# Altium footprint library GSM.PcbLib: 12 footprints
Each footprint in its own frame and in the unit in brackets; x right, y up, seen from the top. Pads: shape width x height; smd on the part's side, far side on the other; paste and mask are expansions set on the pad; w line width, h text height; cw(c..) or ccw(c..) is an arc to the next point about the centre after c.
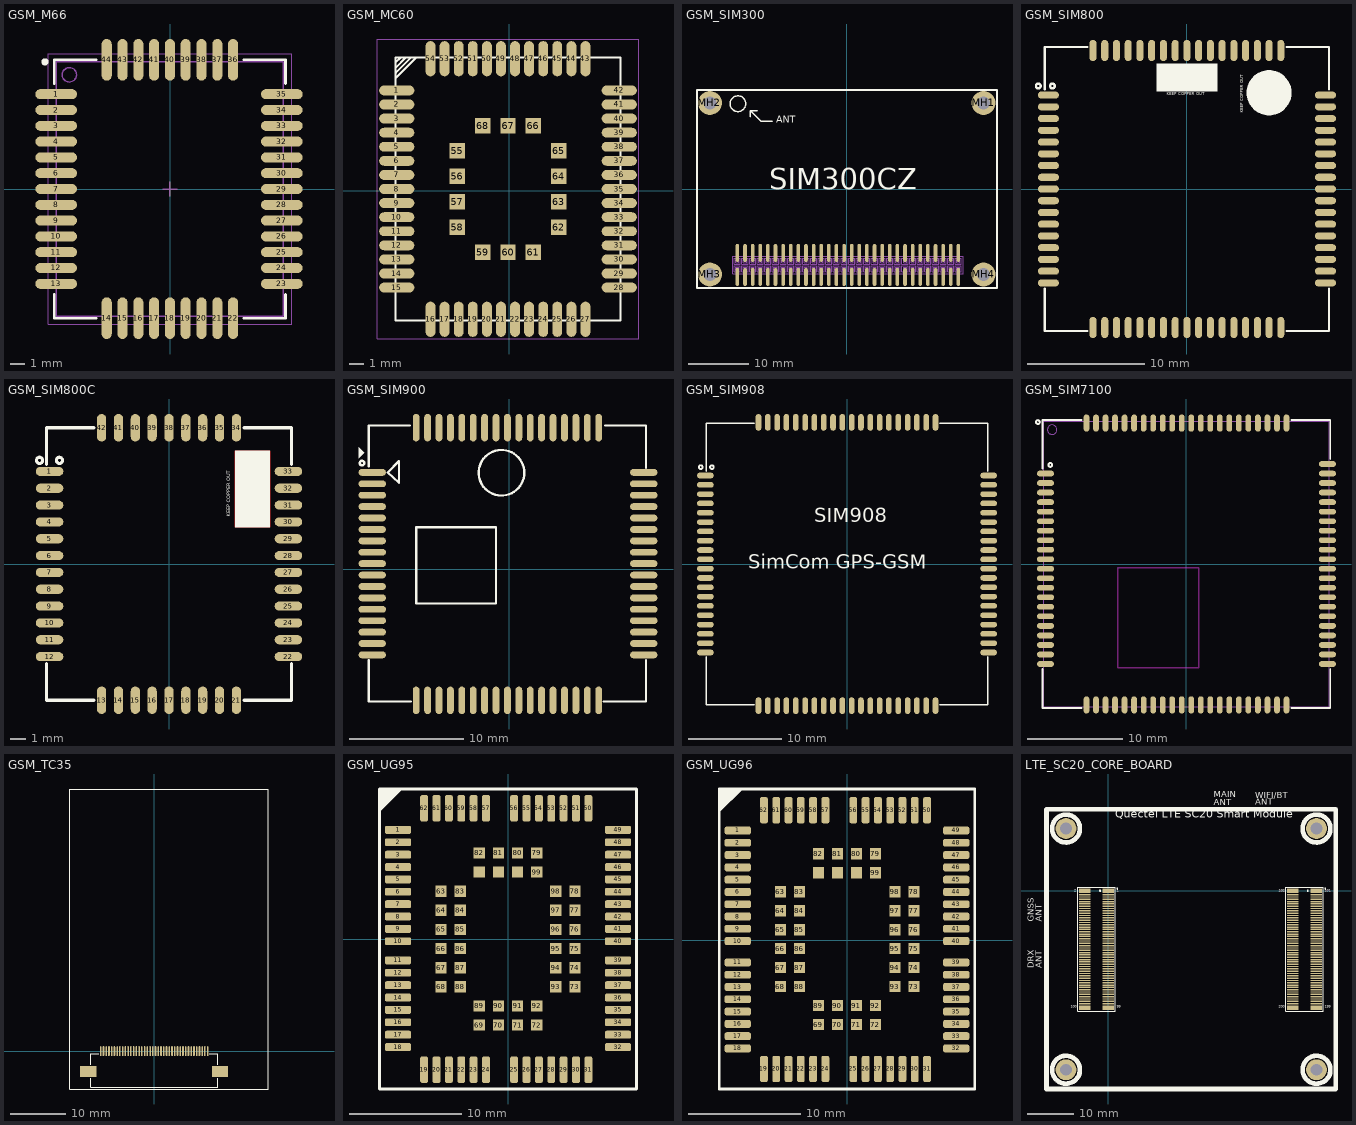
[diagram p0: the footprints below, top view; thin cyan lines are the x and y axes]

## GSM_M66 [mm]
pads (44):
  oval 2.9x0.7 smd: 1(-7.94,6.6) 2(-7.94,5.5) 3(-7.94,4.4) 4(-7.94,3.3) 5(-7.94,2.2) 6(-7.94,1.1) 7(-7.94,0) 8(-7.94,-1.1) 9(-7.94,-2.2) 10(-7.94,-3.3) 11(-7.94,-4.4) 12(-7.94,-5.5) 13(-7.94,-6.6) 23(7.769,-6.6) 24(7.769,-5.5) 25(7.769,-4.4) 26(7.769,-3.3) 27(7.769,-2.2) 28(7.769,-1.1) 29(7.769,0) 30(7.769,1.1) 31(7.769,2.2) 32(7.769,3.3) 33(7.769,4.4) 34(7.769,5.5) 35(7.769,6.6)
  oval 0.7x2.9 smd: 14(-4.422,-8.995) 15(-3.322,-8.995) 16(-2.222,-8.995) 17(-1.122,-8.995) 18(-0.022,-8.995) 19(1.078,-8.995) 20(2.178,-8.995) 21(3.278,-8.995) 22(4.378,-8.995) 36(4.378,8.995) 37(3.278,8.995) 38(2.178,8.995) 39(1.078,8.995) 40(-0.022,8.995) 41(-1.122,8.995) 42(-2.222,8.995) 43(-3.322,8.995) 44(-4.422,8.995)
Top Overlay:
  circle w0.25: c-8.722,8.85 r0.125
  lines w0.2: -8.072,-7.35 -8.072,-9 -5.172,-9 ; -8.072,7.35 -8.072,9 -5.172,9 ; 5.128,-9 8.028,-9 8.028,-7.35 ; 5.128,9 8.028,9 8.028,7.35
Mechanical 13:
  circle w0.1: c-7.022,7.95 r0.5
  lines w0.1: -7.922,-8.85 7.878,-8.85 7.878,8.85 -7.922,8.85 -7.922,-8.85
Mechanical 15:
  lines w0.05: -8.497,-9.425 8.453,-9.425 8.453,9.425 -8.497,9.425 -8.497,-9.425
  lines w0.1: -0.522,0 0.478,0 ; -0.022,-0.5 -0.022,0.5
3D body "User Library-m66_3d_150917_asm.STEP": height 2.3, standoff 0, extent -7.922,-8.85 7.878,8.85

## GSM_MC60 [mm]
pads (68):
  oval 2.5x0.7 smd: 1(-8,7.127) 2(-8,6.127) 3(-8,5.127) 4(-8,4.127) 5(-8,3.127) 6(-8,2.127) 7(-8,1.127) 8(-8,0.127) 9(-8,-0.873) 10(-8,-1.873) 11(-8,-2.873) 12(-8,-3.873) 13(-8,-4.873) 14(-8,-5.873) 15(-8,-6.873) 28(7.8,-6.873) 29(7.8,-5.873) 30(7.8,-4.873) 31(7.8,-3.873) 32(7.8,-2.873) 33(7.8,-1.873) 34(7.8,-0.873) 35(7.8,0.127) 36(7.8,1.127) 37(7.8,2.127) 38(7.8,3.127) 39(7.8,4.127) 40(7.8,5.127) 41(7.8,6.127) 42(7.8,7.127)
  oval 0.7x2.5 smd: 16(-5.6,-9.123) 17(-4.6,-9.123) 18(-3.6,-9.123) 19(-2.6,-9.123) 20(-1.6,-9.123) 21(-0.6,-9.123) 22(0.4,-9.123) 23(1.4,-9.123) 24(2.4,-9.123) 25(3.4,-9.123) 26(4.4,-9.123) 27(5.4,-9.123) 43(5.4,9.377) 44(4.4,9.377) 45(3.4,9.377) 46(2.4,9.377) 47(1.4,9.377) 48(0.4,9.377) 49(-0.6,9.377) 50(-1.6,9.377) 51(-2.6,9.377) 52(-3.6,9.377) 53(-4.6,9.377) 54(-5.6,9.377)
  rect 1.1x1.1 smd: 55(-3.7,2.827) 56(-3.7,1.027) 57(-3.7,-0.773) 58(-3.7,-2.573) 59(-1.9,-4.373) 60(-0.1,-4.373) 61(1.7,-4.373) 62(3.5,-2.573) 63(3.5,-0.773) 64(3.5,1.027) 65(3.5,2.827) 66(1.7,4.627) 67(-0.1,4.627) 68(-1.9,4.627)
Top Overlay:
  lines w0.01: -8.1,9.377 -8,9.477
  lines w0.15: -8.1,8.71 -7.34,9.47 ; -8.1,9.08 -7.715,9.465 ; -8.09,8 -6.625,9.465 ; -8.07,8.38 -6.975,9.475 ; -8.1,-9.223 7.9,-9.223 7.9,9.477 -8.1,9.477 -8.1,-9.223
Mechanical 1:
  lines w0.01: -9.4,-10.523 -9.4,10.777 9.2,10.777 9.2,-10.523 -9.4,-10.523
3D body "User Library-Quectel MC60.STEP": height 2.1, standoff 0, extent -8.1,-9.203 7.903,9.5

## GSM_SIM300 [mm]
height 1.092
pads (64):
  oval 0.6x3 smd: 1(-18.224,-14.6) 2(-18.224,-10.6) 3(-16.954,-14.6) 4(-16.954,-10.6) 5(-15.684,-14.6) 6(-15.684,-10.6) 7(-14.414,-14.6) 8(-14.414,-10.6) 9(-13.144,-14.6) 10(-13.144,-10.6) 11(-11.874,-14.6) 12(-11.874,-10.6) 13(-10.604,-14.6) 14(-10.604,-10.6) 15(-9.335,-14.6) 16(-9.335,-10.6) 17(-8.064,-14.6) 18(-8.064,-10.6) 19(-6.794,-14.6) 20(-6.794,-10.6) 21(-5.524,-14.6) 22(-5.524,-10.6) 23(-4.255,-14.6) 24(-4.255,-10.6) 25(-2.984,-14.6) 26(-2.984,-10.6) 27(-1.714,-14.6) 28(-1.714,-10.6) 29(-0.445,-14.6) 30(-0.445,-10.6) 31(0.826,-14.6) 32(0.826,-10.6) 33(2.095,-14.6) 34(2.095,-10.6) 35(3.365,-14.6) 36(3.365,-10.6) 37(4.635,-14.6) 38(4.635,-10.6) 39(5.905,-14.6) 40(5.905,-10.6) 41(7.175,-14.6) 42(7.175,-10.6) 43(8.445,-14.6) 44(8.445,-10.6) 45(9.716,-14.6) 46(9.716,-10.6) 47(10.986,-14.6) 48(10.986,-10.6) 49(12.255,-14.6) 50(12.255,-10.6) 51(13.525,-14.6) 52(13.525,-10.6) 53(14.795,-14.6) 54(14.795,-10.6) 55(16.066,-14.6) 56(16.066,-10.6) 57(17.335,-14.6) 58(17.335,-10.6) 59(18.605,-14.6) 60(18.605,-10.6)
  round 4 hole 2.2: MH1(22.796,14.395) MH2(-22.796,14.395) MH3(-22.796,-14.18) MH4(22.796,-14.18)
Top Overlay:
  circle w0.254: c-18.135,14.268 r1.308
  lines w0.254: -16.066,12.109 -16.066,13.125 ; -14.922,13.125 -16.066,13.125 ; -12.383,11.347 -14.287,11.347 -16.066,13.125 ; -24.956,-16.446 25.045,-16.446 25.045,16.554 -24.956,16.554 -24.956,-16.446
  text "SIM300CZ" at -12.89,0.044 h3.56
  text "ANT" at -11.747,11.093 h1.14
Mechanical 1:
  drawing of 484 lines, arcs and shapes, not listed
  text "60" at 19.748,-9.862 h0.76
  text "59" at 19.748,-14.434 h0.76
  text "1" at -20.002,-15.45 h0.76
  text "2" at -20.002,-9.862 h0.76
3D body "User Library-SIM300C.step": height 8.79, standoff -3.05, extent -25.971,-16.488 26.51,16.635

## GSM_SIM800 [mm]
pads (68):
  oval 1.8x0.6 smd: 1(-11.8,8) 2(-11.8,7) 3(-11.8,6) 4(-11.8,5) 5(-11.8,4) 6(-11.8,3) 7(-11.8,2) 8(-11.8,1) 9(-11.8,0) 10(-11.8,-1) 11(-11.8,-2) 12(-11.8,-3) 13(-11.8,-4) 14(-11.8,-5) 15(-11.8,-6) 16(-11.8,-7) 17(-11.8,-8) 35(11.8,-8) 36(11.8,-7) 37(11.8,-6) 38(11.8,-5) 39(11.8,-4) 40(11.8,-3) 41(11.8,-2) 42(11.8,-1) 43(11.8,0) 44(11.8,1) 45(11.8,2) 46(11.8,3) 47(11.8,4) 48(11.8,5) 49(11.8,6) 50(11.8,7) 51(11.8,8)
  oval 0.6x1.8 smd: 18(-8,-11.8) 19(-7,-11.8) 20(-6,-11.8) 21(-5,-11.8) 22(-4,-11.8) 23(-3,-11.8) 24(-2,-11.8) 25(-1,-11.8) 26(0,-11.8) 27(1,-11.8) 28(2,-11.8) 29(3,-11.8) 30(4,-11.8) 31(5,-11.8) 32(6,-11.8) 33(7,-11.8) 34(8,-11.8) 52(8,11.8) 53(7,11.8) 54(6,11.8) 55(5,11.8) 56(4,11.8) 57(3,11.8) 58(2,11.8) 59(1,11.8) 60(0,11.8) 61(-1,11.8) 62(-2,11.8) 63(-3,11.8) 64(-4,11.8) 65(-5,11.8) 66(-6,11.8) 67(-7,11.8) 68(-8,11.8)
Top Overlay:
  circle w0.2: c-12.655,8.774 r0.2
  circle w0.2: c-11.455,8.774 r0.2
  rectangle: -2.6,8.3 2.6,10.7
  region: 5.1,8.2 5.1,8.387 5.173,8.754 5.316,9.1 5.524,9.411 5.789,9.676 6.1,9.884 6.446,10.027 6.813,10.1 7,10.1 7.187,10.1 7.554,10.027 7.9,9.884 8.211,9.676 8.476,9.411 8.684,9.1 8.827,8.754 8.9,8.387 8.9,8.2 8.9,8.013 8.827,7.646 8.684,7.3 8.476,6.989 8.211,6.724 7.9,6.516 7.554,6.373 7.187,6.3 7,6.3 6.813,6.3 6.446,6.373 6.1,6.516 5.789,6.724 5.524,6.989 5.316,7.3 5.173,7.646 5.1,8.013
  lines w0.2: -12.1,-8.5 -12.1,-12.1 -8.5,-12.1 ; -12.1,8.5 -12.1,12.1 -8.5,12.1 ; 8.5,-12.1 12.1,-12.1 12.1,-8.5 ; 8.5,12.1 12.1,12.1 12.1,8.5
  text "KEEP COPPER OUT" at -1.7,7.9 h0.4
  text "KEEP COPPER OUT" at 4.9,6.5 h0.4
3D body "User Library-SIM800.step": height 3.1, standoff 0.1, extent -12,-12 12,12

## GSM_SIM800C [mm] "GSM, SIM800C, 42-L, 15.7X17.6mm"
pads (42):
  oval 1.8x0.6 smd: 1(-7.8,6.05) 2(-7.8,4.95) 3(-7.8,3.85) 4(-7.8,2.75) 5(-7.8,1.65) 6(-7.8,0.55) 7(-7.8,-0.55) 8(-7.8,-1.65) 9(-7.8,-2.75) 10(-7.8,-3.85) 11(-7.8,-4.95) 12(-7.8,-6.05) 22(7.8,-6.05) 23(7.8,-4.95) 24(7.8,-3.85) 25(7.8,-2.75) 26(7.8,-1.65) 27(7.8,-0.55) 28(7.8,0.55) 29(7.8,1.65) 30(7.8,2.75) 31(7.8,3.85) 32(7.8,4.95) 33(7.8,6.05)
  oval 0.6x1.8 smd: 13(-4.4,-8.9) 14(-3.3,-8.9) 15(-2.2,-8.9) 16(-1.1,-8.9) 17(0,-8.9) 18(1.1,-8.9) 19(2.2,-8.9) 20(3.3,-8.9) 21(4.4,-8.9) 34(4.4,8.9) 35(3.3,8.9) 36(2.2,8.9) 37(1.1,8.9) 38(0,8.9) 39(-1.1,8.9) 40(-2.2,8.9) 41(-3.3,8.9) 42(-4.4,8.9)
Top Layer:
  pour cut-out: 6.6,7.4 4.3,7.4 4.3,2.4 6.6,2.4
Top Overlay:
  circle w0.2: c-8.455,6.774 r0.2
  circle w0.2: c-7.155,6.774 r0.2
  rectangle: 4.3,2.4 6.6,7.4
  lines w0.2: -8,-6.5 -8,-8.9 -4.9,-8.9 ; -8,6.5 -8,8.9 -4.9,8.9 ; 4.9,-8.9 8,-8.9 8,-6.5 ; 4.9,8.9 8,8.9 8,6.5
  text "KEEP COPPER OUT" at 4.1,3.1 h0.4
3D body "SIM800C-1.STEP": height 2.37, standoff 0.03, extent -7.849,-8.812 7.851,8.788

## GSM_SIM900 [mm] "SIM900_SIM900A"
pads (68):
  oval 2.4x0.6 smd mask+0.1: 1(-12,8.48) 2(-12,7.48) 3(-12,6.48) 4(-12,5.48) 5(-12,4.48) 6(-12,3.48) 7(-12,2.48) 8(-12,1.48) 9(-12,0.48) 10(-12,-0.52) 11(-12,-1.52) 12(-12,-2.52) 13(-12,-3.52) 14(-12,-4.52) 15(-12,-5.52) 16(-12,-6.52) 17(-12,-7.52) 35(11.8,-7.52) 36(11.8,-6.52) 37(11.8,-5.52) 38(11.8,-4.52) 39(11.8,-3.52) 40(11.8,-2.52) 41(11.8,-1.52) 42(11.8,-0.52) 43(11.8,0.48) 44(11.8,1.48) 45(11.8,2.48) 46(11.8,3.48) 47(11.8,4.48) 48(11.8,5.48) 49(11.8,6.48) 50(11.8,7.48) 51(11.8,8.48)
  oval 0.6x2.4 smd mask+0.1: 18(-8.15,-11.5) 19(-7.15,-11.5) 20(-6.15,-11.5) 21(-5.15,-11.5) 22(-4.15,-11.5) 23(-3.15,-11.5) 24(-2.15,-11.5) 25(-1.15,-11.5) 26(-0.15,-11.5) 27(0.85,-11.5) 28(1.85,-11.5) 29(2.85,-11.5) 30(3.85,-11.5) 31(4.85,-11.5) 32(5.85,-11.5) 33(6.85,-11.5) 34(7.85,-11.5) 52(7.85,12.4) 53(6.85,12.4) 54(5.85,12.4) 55(4.85,12.4) 56(3.85,12.4) 57(2.85,12.4) 58(1.85,12.4) 59(0.85,12.4) 60(-0.15,12.4) 61(-1.15,12.4) 62(-2.15,12.4) 63(-3.15,12.4) 64(-4.15,12.4) 65(-5.15,12.4) 66(-6.15,12.4) 67(-7.15,12.4) 68(-8.15,12.4)
Top Overlay:
  circle w0.2: c-0.67,8.45 r2
  circle w0.2: c-12.9,9.3 r0.2
  region: -13.2,9.7 -13.2,10.7 -12.7,10.2
  lines w0.2: -12.3,-8 -12.3,-11.6 -8.6,-11.6 ; -12.3,9 -12.3,12.6 -8.7,12.6 ; 8.3,-11.6 12,-11.6 12,-8 ; 8.4,12.6 12,12.6 12,8.9 ; -10.65,8.48 -9.65,7.58 -9.65,9.48 -10.65,8.48 ; -8.15,-3.02 -8.15,3.68 -1.15,3.68 -1.15,-3.02 -8.15,-3.02
3D body "GSM_SIM900.STEP": height 3, standoff 0, extent -12.15,-11.5 11.85,12.5

## GSM_SIM908 [mm] "SimCom Sim908 GPS/GSM"
pads (80):
  oval 1.8x0.6 smd: 1(-15.2,9.5) 2(-15.2,8.5) 3(-15.2,7.5) 4(-15.2,6.5) 5(-15.2,5.5) 6(-15.2,4.5) 7(-15.2,3.5) 8(-15.2,2.5) 9(-15.2,1.5) 10(-15.2,0.5) 11(-15.2,-0.5) 12(-15.2,-1.5) 13(-15.2,-2.5) 14(-15.2,-3.5) 15(-15.2,-4.5) 16(-15.2,-5.5) 17(-15.2,-6.5) 18(-15.2,-7.5) 19(-15.2,-8.5) 20(-15.2,-9.5) 41(15.2,-9.5) 42(15.2,-8.5) 43(15.2,-7.5) 44(15.2,-6.5) 45(15.2,-5.5) 46(15.2,-4.5) 47(15.2,-3.5) 48(15.2,-2.5) 49(15.2,-1.5) 50(15.2,-0.5) 51(15.2,0.5) 52(15.2,1.5) 53(15.2,2.5) 54(15.2,3.5) 55(15.2,4.5) 56(15.2,5.5) 57(15.2,6.5) 58(15.2,7.5) 59(15.2,8.5) 60(15.2,9.5)
  oval 0.6x1.8 smd: 21(-9.5,-15.2) 22(-8.5,-15.2) 23(-7.5,-15.2) 24(-6.5,-15.2) 25(-5.5,-15.2) 26(-4.5,-15.2) 27(-3.5,-15.2) 28(-2.5,-15.2) 29(-1.5,-15.2) 30(-0.5,-15.2) 31(0.5,-15.2) 32(1.5,-15.2) 33(2.5,-15.2) 34(3.5,-15.2) 35(4.5,-15.2) 36(5.5,-15.2) 37(6.5,-15.2) 38(7.5,-15.2) 39(8.5,-15.2) 40(9.5,-15.2) 61(9.5,15.2) 62(8.5,15.2) 63(7.5,15.2) 64(6.5,15.2) 65(5.5,15.2) 66(4.5,15.2) 67(3.5,15.2) 68(2.5,15.2) 69(1.5,15.2) 70(0.5,15.2) 71(-0.5,15.2) 72(-1.5,15.2) 73(-2.5,15.2) 74(-3.5,15.2) 75(-4.5,15.2) 76(-5.5,15.2) 77(-6.5,15.2) 78(-7.5,15.2) 79(-8.5,15.2) 80(-9.5,15.2)
Top Overlay:
  circle w0.2: c-14.5,10.4 r0.2
  circle w0.2: c-15.7,10.4 r0.2
  lines w0.2: -15.1,-10 -15.1,-15.1 -10,-15.1 ; -15.1,10 -15.1,15.1 -10,15.1 ; 10,-15.1 15.1,-15.1 15.1,-10 ; 10,15.1 15.1,15.1 15.1,10
  text "SimCom GPS-GSM" at -10.576,-0.5 h1.52
  text "SIM908" at -3.5,4.5 h1.52
3D body "User Library-SIM908.STEP": height 3.39, standoff 0.19, extent -15,-15 15,15

## GSM_SIM7100 [mm] "SIM7100 SIM5360 87-lead pitch:1mm 30x30mm"
height 2.9
pads (87):
  oval 1.8x0.6 smd mask+0.075: 1(-14.8,9.5) 2(-14.8,8.5) 3(-14.8,7.5) 4(-14.8,6.5) 5(-14.8,5.5) 6(-14.8,4.5) 7(-14.8,3.5) 8(-14.8,2.5) 9(-14.8,1.5) 10(-14.8,0.5) 11(-14.8,-0.5) 12(-14.8,-1.5) 13(-14.8,-2.5) 14(-14.8,-3.5) 15(-14.8,-4.5) 16(-14.8,-5.5) 17(-14.8,-6.5) 18(-14.8,-7.5) 19(-14.8,-8.5) 20(-14.8,-9.5) 41(14.8,-9.5) 42(14.8,-8.5) 43(14.8,-7.5) 44(14.8,-6.5) 45(14.8,-5.5) 46(14.8,-4.5) 47(14.8,-3.5) 48(14.8,-2.5) 49(14.8,-1.5) 50(14.8,-0.5) 51(14.8,0.5) 52(14.8,1.5) 53(14.8,2.5) 54(14.8,3.5) 55(14.8,4.5) 56(14.8,5.5) 57(14.8,6.5) 58(14.8,7.5) 59(14.8,8.5) 60(14.8,9.5) 81(-14.8,-10.5) 82(14.8,-10.5) 85(14.8,10.5)
  oval 0.6x1.8 smd mask+0.075: 21(-9.5,-14.8) 22(-8.5,-14.8) 23(-7.5,-14.8) 24(-6.5,-14.8) 25(-5.5,-14.8) 26(-4.5,-14.8) 27(-3.5,-14.8) 28(-2.5,-14.8) 29(-1.5,-14.8) 30(-0.5,-14.8) 31(0.5,-14.8) 32(1.5,-14.8) 33(2.5,-14.8) 34(3.5,-14.8) 35(4.5,-14.8) 36(5.5,-14.8) 37(6.5,-14.8) 38(7.5,-14.8) 39(8.5,-14.8) 40(9.5,-14.8) 61(9.5,14.8) 62(8.5,14.8) 63(7.5,14.8) 64(6.5,14.8) 65(5.5,14.8) 66(4.5,14.8) 67(3.5,14.8) 68(2.5,14.8) 69(1.5,14.8) 70(0.5,14.8) 71(-0.5,14.8) 72(-1.5,14.8) 73(-2.5,14.8) 74(-3.5,14.8) 75(-4.5,14.8) 76(-5.5,14.8) 77(-6.5,14.8) 78(-7.5,14.8) 79(-8.5,14.8) 80(-9.5,14.8) 83(10.5,-14.8) 84(-10.5,-14.8) 86(-10.5,14.8) 87(10.5,14.8)
Top Overlay:
  circle w0.2: c-14.3,10.4 r0.2
  circle w0.2: c-15.6,14.9 r0.2
  lines w0.2: -15.1,-11 -15.1,-15.1 -11,-15.1 ; -15.1,10 -15.1,15.1 -11,15.1 ; 11,-15.1 15.1,-15.1 15.1,-11 ; 11,15.1 15.1,15.1 15.1,11
Keep-Out Layer:
  lines w0.15: -7.2,-10.9 -7.2,-0.4 1.3,-0.4 1.3,-10.9 -7.2,-10.9
Mechanical 13:
  circle w0.1: c-14.1,14.1 r0.5
  lines w0.1: -15,-15 -15,15 15,15 15,-15 -15,-15
3D body "User Library-SIM7100C.step": height 3.17, standoff 0, extent -15,-15 15,15

## GSM_TC35 [mm]
pads (42):
  oval 0.3x1.8 smd mask+0.05: 1(9.75,0) 2(9.25,0) 3(8.75,0) 4(8.25,0) 5(7.75,0) 6(7.25,0) 7(6.75,0) 8(6.25,0) 9(5.75,0) 10(5.25,0) 11(4.75,0) 12(4.25,0) 13(3.75,0) 14(3.25,0) 15(2.75,0) 16(2.25,0) 17(1.75,0) 18(1.25,0) 19(0.75,0) 20(0.25,0) 21(-0.25,0) 22(-0.75,0) 23(-1.25,0) 24(-1.75,0) 25(-2.25,0) 26(-2.75,0) 27(-3.25,0) 28(-3.75,0) 29(-4.25,0) 30(-4.75,0) 31(-5.25,0) 32(-5.75,0) 33(-6.25,0) 34(-6.75,0) 35(-7.25,0) 36(-7.75,0) 37(-8.25,0) 38(-8.75,0) 39(-9.25,0) 40(-9.75,0)
  rrect0% 3x2 smd: ""(-12,-3.7) ""(12,-3.7)
Top Overlay:
  lines w0.2: -11.6,-4.9 -11.6,-6.6 11.55,-6.6 ; -11.6,-2.5 -11.6,-0.5 -10.074,-0.5 ; 10.074,-0.5 11.6,-0.5 11.6,-2.5 ; 11.6,-6.6 11.6,-4.9 ; -15.4,-6.9 20.8,-6.9 20.8,47.8 -15.4,47.8 -15.4,-6.9
3D body: height 3, standoff 0.1, extent -11.5,-6.6 11.55,-0.6
3D body "User Library-siemens tc35i module.STEP": height 5.55, standoff 2, extent -15.264,-6.772 20.736,47.728

## GSM_UG95 [mm]
pads (102):
  rrect50% 2.35x0.7 smd: 1(-9.779,9.696) 2(-9.779,8.595) 3(-9.779,7.495) 4(-9.779,6.395) 5(-9.779,5.295) 6(-9.779,4.196) 7(-9.779,3.096) 8(-9.779,1.996) 9(-9.779,0.895) 10(-9.779,-0.205) 11(-9.779,-1.904) 12(-9.779,-3.004) 13(-9.779,-4.105) 14(-9.779,-5.205) 15(-9.779,-6.305) 16(-9.779,-7.404) 17(-9.779,-8.504) 18(-9.779,-9.604) 32(9.779,-9.604) 33(9.779,-8.504) 34(9.779,-7.404) 35(9.779,-6.305) 36(9.779,-5.205) 37(9.779,-4.105) 38(9.779,-3.004) 39(9.779,-1.904) 40(9.779,-0.205) 41(9.779,0.895) 42(9.779,1.996) 43(9.779,3.096) 44(9.779,4.196) 45(9.779,5.295) 46(9.779,6.395) 47(9.779,7.495) 48(9.779,8.595) 49(9.779,9.696)
  rrect50% 0.7x2.35 smd: 19(-7.454,-11.62) 20(-6.354,-11.62) 21(-5.254,-11.62) 22(-4.154,-11.62) 23(-3.054,-11.62) 24(-1.954,-11.62) 25(0.546,-11.62) 26(1.646,-11.62) 27(2.746,-11.62) 28(3.846,-11.62) 29(4.946,-11.62) 30(6.046,-11.62) 31(7.146,-11.62) 50(7.146,11.62) 51(6.046,11.62) 52(4.946,11.62) 53(3.846,11.62) 54(2.746,11.62) 55(1.646,11.62) 56(0.546,11.62) 57(-1.954,11.62) 58(-3.054,11.62) 59(-4.154,11.62) 60(-5.254,11.62) 61(-6.354,11.62) 62(-7.454,11.62)
  rect 1x1 smd: 63(-5.954,4.246) 64(-5.954,2.546) 65(-5.954,0.846) 66(-5.954,-0.845) 67(-5.954,-2.546) 68(-5.954,-4.246) 69(-2.554,-7.645) 70(-0.854,-7.645) 71(0.846,-7.645) 72(2.546,-7.645) 73(5.945,-4.254) 74(5.945,-2.554) 75(5.945,-0.854) 76(5.945,0.846) 77(5.945,2.546) 78(5.945,4.246) 79(2.546,7.655) 80(0.846,7.655) 81(-0.854,7.654) 82(-2.554,7.655) 83(-4.255,4.246) 84(-4.255,2.546) 85(-4.255,0.846) 86(-4.255,-0.854) 87(-4.255,-2.554) 88(-4.255,-4.254) 89(-2.554,-5.945) 90(-0.854,-5.945) 91(0.846,-5.945) 92(2.546,-5.945) 93(4.246,-4.246) 94(4.246,-2.546) 95(4.246,-0.845) 96(4.246,0.846) 97(4.246,2.546) 98(4.246,4.246) 99(2.546,5.954) 100(0.846,5.955) 101(-0.854,5.954) 102(-2.554,5.955)
Top Overlay:
  region: -11.43,11.43 -11.43,13.335 -9.525,13.335
  lines w0.254: -11.43,11.43 -9.525,13.335 ; -11.43,-13.335 -11.43,13.335 11.43,13.335 11.43,-13.335 -11.43,-13.335
3D body: height 2.2, standoff 0.05, extent -9.906,-11.811 10.033,11.811

## GSM_UG96 [mm]
pads (102):
  rrect50% 2.35x0.7 smd: 1(-9.779,9.805) 2(-9.779,8.705) 3(-9.779,7.605) 4(-9.779,6.505) 5(-9.779,5.405) 6(-9.779,4.306) 7(-9.779,3.206) 8(-9.779,2.105) 9(-9.779,1.005) 10(-9.779,-0.095) 11(-9.779,-2.004) 12(-9.779,-3.104) 13(-9.779,-4.205) 14(-9.779,-5.305) 15(-9.779,-6.405) 16(-9.779,-7.504) 17(-9.779,-8.604) 18(-9.779,-9.704) 32(9.779,-9.704) 33(9.779,-8.605) 34(9.779,-7.505) 35(9.779,-6.405) 36(9.779,-5.305) 37(9.779,-4.205) 38(9.779,-3.105) 39(9.779,-2.005) 40(9.779,-0.095) 41(9.779,1.005) 42(9.779,2.105) 43(9.779,3.205) 44(9.779,4.305) 45(9.779,5.405) 46(9.779,6.505) 47(9.779,7.605) 48(9.779,8.705) 49(9.779,9.805)
  rrect50% 0.7x2.35 smd: 19(-7.434,-11.541) 20(-6.334,-11.541) 21(-5.234,-11.541) 22(-4.134,-11.541) 23(-3.034,-11.541) 24(-1.934,-11.541) 25(0.566,-11.541) 26(1.666,-11.541) 27(2.766,-11.541) 28(3.866,-11.541) 29(4.966,-11.541) 30(6.066,-11.541) 31(7.166,-11.541) 50(7.166,11.62) 51(6.066,11.62) 52(4.966,11.62) 53(3.866,11.62) 54(2.766,11.62) 55(1.666,11.62) 56(0.566,11.62) 57(-1.934,11.62) 58(-3.034,11.62) 59(-4.134,11.62) 60(-5.234,11.62) 61(-6.334,11.62) 62(-7.434,11.62)
  rect 1x1 smd: 63(-5.954,4.326) 64(-5.954,2.626) 65(-5.954,0.926) 66(-5.954,-0.765) 67(-5.954,-2.466) 68(-5.954,-4.166) 69(-2.554,-7.565) 70(-0.854,-7.565) 71(0.846,-7.565) 72(2.546,-7.565) 73(5.995,-4.166) 74(5.995,-2.466) 75(5.995,-0.765) 76(5.995,0.926) 77(5.995,2.626) 78(5.995,4.326) 79(2.546,7.725) 80(0.846,7.725) 81(-0.854,7.724) 82(-2.554,7.725) 83(-4.255,4.326) 84(-4.255,2.626) 85(-4.255,0.926) 86(-4.255,-0.765) 87(-4.255,-2.466) 88(-4.255,-4.166) 89(-2.554,-5.866) 90(-0.854,-5.866) 91(0.846,-5.866) 92(2.546,-5.866) 93(4.296,-4.166) 94(4.296,-2.466) 95(4.296,-0.765) 96(4.296,0.926) 97(4.296,2.626) 98(4.296,4.326) 99(2.546,6.024) 100(0.846,6.025) 101(-0.854,6.024) 102(-2.554,6.025)
Top Overlay:
  region: -11.42,11.59 -11.42,13.495 -9.515,13.495
  lines w0.254: -11.43,13.495 -11.43,-13.335 11.43,-13.335 11.43,13.52 -11.43,13.52 ; -11.42,11.59 -9.515,13.495
3D body "User Library-MOD_QUECTEL_UG96.STEP": height 2.2, standoff 0, extent -11.236,-13.15 11.264,13.35

## LTE_SC20_CORE_BOARD [mm]
pads (204):
  rrect20% 2.5x1 smd mask+0.075: 1(0,0) 2(-5.1,0) 99(0,-25.2) 100(-5.1,-25.2) 101(44.85,0) 102(39.77,0) 199(44.85,-25.2) 200(39.77,-25.2)
  rrect20% 2.5x0.3 smd mask+0.075: 3(0,-0.85) 4(-5.08,-0.85) 5(0,-1.35) 6(-5.08,-1.35) 7(0,-1.85) 8(-5.08,-1.85) 9(0,-2.35) 10(-5.08,-2.35) 11(0,-2.85) 12(-5.08,-2.85) 13(0,-3.35) 14(-5.08,-3.35) 15(0,-3.85) 16(-5.08,-3.85) 17(0,-4.35) 18(-5.08,-4.35) 19(0,-4.85) 20(-5.08,-4.85) 21(0,-5.35) 22(-5.08,-5.35) 23(0,-5.85) 24(-5.08,-5.85) 25(0,-6.35) 26(-5.08,-6.35) 27(0,-6.85) 28(-5.08,-6.85) 29(0,-7.35) 30(-5.08,-7.35) 31(0,-7.85) 32(-5.08,-7.85) 33(0,-8.35) 34(-5.08,-8.35) 35(0,-8.85) 36(-5.08,-8.85) 37(0,-9.35) 38(-5.08,-9.35) 39(0,-9.85) 40(-5.08,-9.85) 41(0,-10.35) 42(-5.08,-10.35) 43(0,-10.85) 44(-5.08,-10.85) 45(0,-11.35) 46(-5.08,-11.35) 47(0,-11.85) 48(-5.08,-11.85) 49(0,-12.35) 50(-5.08,-12.35) 51(0,-12.85) 52(-5.08,-12.85) 53(0,-13.35) 54(-5.08,-13.35) 55(0,-13.85) 56(-5.08,-13.85) 57(0,-14.35) 58(-5.08,-14.35) 59(0,-14.85) 60(-5.08,-14.85) 61(0,-15.35) 62(-5.08,-15.35) 63(0,-15.85) 64(-5.08,-15.85) 65(0,-16.35) 66(-5.08,-16.35) 67(0,-16.85) 68(-5.08,-16.85) 69(0,-17.35) 70(-5.08,-17.35) 71(0,-17.85) 72(-5.08,-17.85) 73(0,-18.35) 74(-5.08,-18.35) 75(0,-18.85) 76(-5.08,-18.85) 77(0,-19.35) 78(-5.08,-19.35) 79(0,-19.85) 80(-5.08,-19.85) 81(0,-20.35) 82(-5.08,-20.35) 83(0,-20.85) 84(-5.08,-20.85) 85(0,-21.35) 86(-5.08,-21.35) 87(0,-21.85) 88(-5.08,-21.85) 89(0,-22.35) 90(-5.08,-22.35) 91(0,-22.85) 92(-5.08,-22.85) 93(0,-23.35) 94(-5.08,-23.35) 95(0,-23.85) 96(-5.08,-23.85) 97(0,-24.35) 98(-5.08,-24.35) 103(44.85,-0.85) 104(39.77,-0.85) 105(44.85,-1.35) 106(39.77,-1.35) 107(44.85,-1.85) 108(39.77,-1.85) 109(44.85,-2.35) 110(39.77,-2.35) 111(44.85,-2.85) 112(39.77,-2.85) 113(44.85,-3.35) 114(39.77,-3.35) 115(44.85,-3.85) 116(39.77,-3.85) 117(44.85,-4.35) 118(39.77,-4.35) 119(44.85,-4.85) 120(39.77,-4.85) 121(44.85,-5.35) 122(39.77,-5.35) 123(44.85,-5.85) 124(39.77,-5.85) 125(44.85,-6.35) 126(39.77,-6.35) 127(44.85,-6.85) 128(39.77,-6.85) 129(44.85,-7.35) 130(39.77,-7.35) 131(44.85,-7.85) 132(39.77,-7.85) 133(44.85,-8.35) 134(39.77,-8.35) 135(44.85,-8.85) 136(39.77,-8.85) 137(44.85,-9.35) 138(39.77,-9.35) 139(44.85,-9.85) 140(39.77,-9.85) 141(44.85,-10.35) 142(39.77,-10.35) 143(44.85,-10.85) 144(39.77,-10.85) 145(44.85,-11.35) 146(39.77,-11.35) 147(44.85,-11.85) 148(39.77,-11.85) 149(44.85,-12.35) 150(39.77,-12.35) 151(44.85,-12.85) 152(39.77,-12.85) 153(44.85,-13.35) 154(39.77,-13.35) 155(44.85,-13.85) 156(39.77,-13.85) 157(44.85,-14.35) 158(39.77,-14.35) 159(44.85,-14.85) 160(39.77,-14.85) 161(44.85,-15.35) 162(39.77,-15.35) 163(44.85,-15.85) 164(39.77,-15.85) 165(44.85,-16.35) 166(39.77,-16.35) 167(44.85,-16.85) 168(39.77,-16.85) 169(44.85,-17.35) 170(39.77,-17.35) 171(44.85,-17.85) 172(39.77,-17.85) 173(44.85,-18.35) 174(39.77,-18.35) 175(44.85,-18.85) 176(39.77,-18.85) 177(44.85,-19.35) 178(39.77,-19.35) 179(44.85,-19.85) 180(39.77,-19.85) 181(44.85,-20.35) 182(39.77,-20.35) 183(44.85,-20.85) 184(39.77,-20.85) 185(44.85,-21.35) 186(39.77,-21.35) 187(44.85,-21.85) 188(39.77,-21.85) 189(44.85,-22.35) 190(39.77,-22.35) 191(44.85,-22.85) 192(39.77,-22.85) 193(44.85,-23.35) 194(39.77,-23.35) 195(44.85,-23.85) 196(39.77,-23.85) 197(44.85,-24.35) 198(39.77,-24.35)
  round 4.5 hole 2.5: ""(-9.1,-38.6) ""(-9.1,13.4) ""(44.9,-38.6) ""(44.9,13.4)
Top Overlay:
  circle w0.2: c1.95,0.45 r0.1
  circle w0.2: c-1.75,0 r0.15
  circle w0.2: c43.02,0 r0.15
  circle w0.2: c46.81,0.45 r0.1
  lines w0.2: -6.57,-25.95 1.5,-25.95 1.5,0.75 -6.57,0.75 -6.57,-25.95 ; 38.28,-25.95 38.28,0.75 46.35,0.75 46.35,-25.95 38.28,-25.95
  lines w1: -6.105,-38.434 cw(c-9.1,-38.6) -6.105,-38.429 ; -6.105,13.566 cw(c-9.1,13.4) -6.105,13.571 ; 47.895,-38.434 cw(c44.9,-38.6) 47.895,-38.429 ; 47.895,13.566 cw(c44.9,13.4) 47.895,13.571 ; -13.3,-42.75 49.05,-42.75 49.05,17.55 -13.3,17.55 -13.3,-42.75 ; -13.3,-42.75 -13.3,-42.75 ; -13.3,-42.75 -13.3,-42.75
  text "ANT" at -13.75,-16.7 h2.3
  text "DRX" at -15.522,-16.7 h2.3
  text "100" at -8.1,-25.45 h1
  text "99" at 1.8,-25.45 h1
  text "1" at 1.8,-0.45 h1
  text "2" at -7.283,-0.45 h1
  text "102" at 36.75,-0.45 h1
  text "101" at 46.65,-0.45 h1
  text "199" at 46.65,-25.45 h1
  text "200" at 36.75,-25.45 h1
  text "Quectel LTE SC20 Smart Module" at 1.55,15.1 h3
  text "WIFI/BT" at 31.698,19.371 h2.3
  text "ANT" at 31.698,18 h2.3
  text "ANT" at 22.728,17.85 h2.3
  text "MAIN" at 22.728,19.622 h2.3
  text "GNSS" at -15.522,-6.65 h2.3
  text "ANT" at -13.75,-6.65 h2.3
3D body "DF23C-20DP-0.5V.stp": height 1.2, standoff 0, extent -4.61,-20.85 -0.31,-14.35
3D body "DF23C-20DP-0.5V.stp": height 1.2, standoff 0, extent -4.61,-15.85 -0.31,-9.35
3D body "DF23C-20DP-0.5V.stp": height 1.2, standoff 0, extent -4.61,-10.85 -0.31,-4.35
3D body "DF23C-20DP-0.5V.stp": height 1.2, standoff 0, extent -4.61,-25.85 -0.31,-19.35
3D body "DF23C-20DP-0.5V.stp": height 1.2, standoff 0, extent -4.61,-5.85 -0.31,0.65
3D body "DF23C-20DP-0.5V.stp": height 1.2, standoff 0, extent 40.24,-5.85 44.54,0.65
3D body "DF23C-20DP-0.5V.stp": height 1.2, standoff 0, extent 40.24,-25.85 44.54,-19.35
3D body "DF23C-20DP-0.5V.stp": height 1.2, standoff 0, extent 40.24,-10.85 44.54,-4.35
3D body "DF23C-20DP-0.5V.stp": height 1.2, standoff 0, extent 40.24,-15.85 44.54,-9.35
3D body "DF23C-20DP-0.5V.stp": height 1.2, standoff 0, extent 40.24,-20.85 44.54,-14.35
3D body "Screw_M3x5.stp": height 6.28, standoff -1, extent -11.839,10.655 -6.361,16.145
3D body "Screw_M3x5.stp": height 6.28, standoff -1, extent 42.161,10.655 47.639,16.145
3D body "Screw_M3x5.stp": height 6.28, standoff -1, extent 42.161,-41.345 47.639,-35.855
3D body "Screw_M3x5.stp": height 6.28, standoff -1, extent -11.839,-41.345 -6.361,-35.855
3D body "SC20-TE-A_PCB_V1.3_160114.step": height 4, standoff 3.08, extent -13,-42.55 49.1,17.55